# Altium footprint library MyPcbLib.PcbLib: 80 footprints (part 5 of 5)
Each footprint in its own frame and in the unit in brackets; x right, y up, seen from the top. Pads: shape width x height; smd on the part's side, far side on the other; paste and mask are expansions set on the pad; w line width, h text height; cw(c..) or ccw(c..) is an arc to the next point about the centre after c.
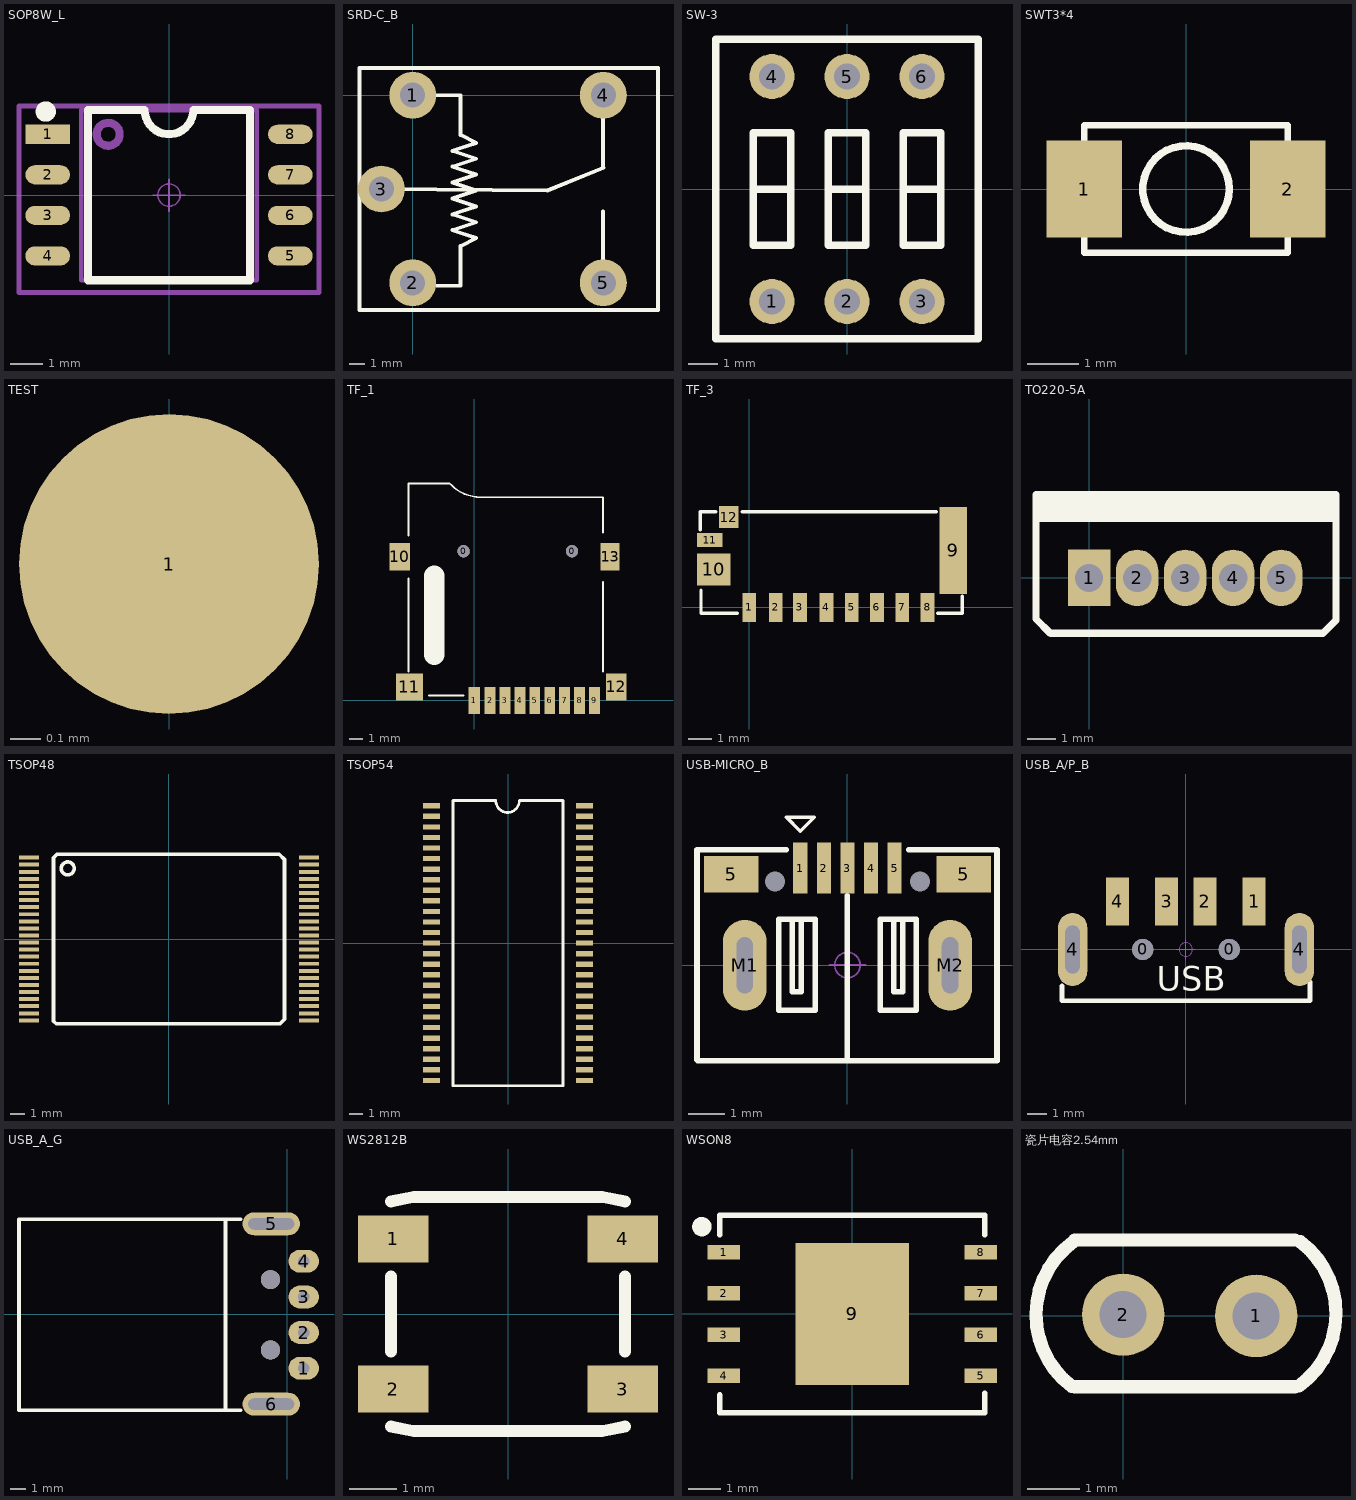
[diagram p4: the footprints below, top view; thin cyan lines are the x and y axes]

## SOP8W_L [mm]
pads (8):
  rect 1.4x0.6 smd: 1(-3.8,1.905)
  oval 1.4x0.6 smd: 2(-3.8,0.635) 3(-3.8,-0.635) 4(-3.8,-1.905) 5(3.8,-1.905) 6(3.8,-0.635) 7(3.8,0.635) 8(3.8,1.905)
Top Overlay:
  circle w0.381: c-3.861,2.616 r0.127
  lines w0.254: -2.54,-2.667 -2.54,2.667 -0.762,2.667 ccw(c0,2.667) 0.762,2.667 2.54,2.667 2.54,-2.667 -2.54,-2.667
Mechanical 13:
  circle w0.254: c-1.905,1.905 r0.359
  lines w0.15: -2.75,-2.667 2.75,-2.667 2.75,2.667 -2.75,2.667 -2.75,-2.667
Mechanical 15:
  circle w0.05: c0,0 r0.35
  lines w0.05: -0.5,0 0.5,0 ; 0,-0.5 0,0.5
  lines w0.15: -4.699,-3.048 -4.699,2.794 4.699,2.794 4.699,-3.048 -4.699,-3.048
3D body "SOP8W.STEP": height 1.9, standoff 0, extent -3.943,-2.64 3.943,2.64

## SRD-C_B [mm] "单刀双投"
pads (5):
  round 3 hole 1.6: 1(0,0) 2(0,-12) 3(-2,-6) 4(12.2,0) 5(12.2,-12)
Top Overlay:
  lines w0.254: -2,-6 8.636,-6.096 12.22,-4.64 ; 1.524,-12.192 3.048,-12.192 3.048,-10.668 3.048,-9.652 4.064,-9.144 2.54,-8.636 4.064,-8.128 2.54,-7.62 4.064,-7.112 2.54,-6.604 4.064,-6.096 2.54,-5.588 4.064,-5.08 2.54,-4.572 4.064,-4.064 2.54,-3.556 4.064,-3.048 3.048,-2.54 3.048,0 1.524,0 ; 12.192,-10.668 12.192,-8.636 ; 12.192,-9.144 12.192,-7.429 ; 12.192,-4.572 12.192,-1.524 ; -3.4,-13.75 15.7,-13.75 15.7,1.75 -3.4,1.75 -3.4,-13.75
3D body "小型继电器SRD-05VDC-SL-C.SLDPRT": height 15.3, standoff -5, extent -3.352,-13.846 15.748,1.654

## SW-3 [mil] "WWW.OURAVR.COM"
pads (6):
  round 60 hole 35: 1(-100,-150) 2(0,-150) 3(100,-150) 4(-100,150) 5(0,150) 6(100,150)
Top Overlay:
  lines w10: -75,0 -125,0 -125,75 ; 25,0 -25,0 -25,75 ; 125,0 75,0 75,75 ; -125,75 -125,-75 -75,-75 -75,75 -125,75 ; -25,75 -25,-75 25,-75 25,75 -25,75 ; 75,75 75,-75 125,-75 125,75 75,75 ; -175,-200 -175,200 175,200 175,-200 -175,-200
3D body "SWITCH DIP-3.STEP": height 275.59, standoff -145.67, extent -170,-194.88 169.37,194.88

## SWT3*4 [mm]
pads (2):
  rect 1.48x1.9 smd: 1(-2,0) 2(2,0)
Top Overlay:
  circle w0.15: c0,0 r0.85
  lines w0.127: -2,-1.25 2,-1.25 2,1.25 -2,1.25 -2,-1.25
3D body "SW-PB 3X4.STEP": height 2.1, standoff -0.05, extent -2.5,-1.527 2.5,1.473

## TEST [mm]
pads (1):
  round 1 smd: 1(0,1.4)

## TF_1 [mm]
pads (15):
  round 0.9 hole 0.9 unplated: 0(-0.8,11) 0(7.2,11)
  rect 0.85x2 smd: 1(0,0)
  rect 0.8x2 smd: 2(1.15,0) 3(2.25,0) 4(3.35,0) 5(4.45,0) 6(5.55,0) 7(6.65,0) 8(7.75,0) 9(8.85,0)
  rect 1.5x2 smd: 10(-5.5,10.6) 12(10.45,1)
  rect 2x2 smd: 11(-4.8,1)
  rect 1.4x2 smd: 13(10,10.6)
Top Overlay:
  lines w0.127: -4.865,12.143 -4.865,15 ; -4.865,14.683 -4.865,16 -1.816,16 -1.714,15.898 ccw(c0.454,18.066) 0.454,15 1.74,15 9.486,15 9.486,12.397 ; -4.862,2.138 -4.862,8.996 ; 9.489,2.138 9.489,8.742
  lines w0.15: -3.338,0.36 -0.798,0.36
  lines w1.5: -2.959,3.38 -2.959,9.222
3D body "User Library-112J-TXAR-R_C_1-1.STEP": height 1.85, standoff -0.6, extent -5.85,-0.001 10.25,15.001

## TF_3 [mm]
pads (12):
  rect 0.6x1.25 smd: 1(0,0) 2(1.15,0) 3(2.2,0) 4(3.35,0) 5(4.45,0) 6(5.55,0) 7(6.65,0) 8(7.75,0)
  rect 1.2x3.79 smd: 9(8.875,2.48)
  rect 1.45x1.4 smd: 10(-1.55,1.655)
  rect 1.1x0.6 smd: 11(-1.725,2.93)
  rect 0.85x0.95 smd: 12(-0.9,3.93)
Top Overlay:
  lines w0.15: -2.125,3.38 -2.125,4.155 -1.45,4.155 ; -2.1,0.755 -2.1,-0.245 -0.525,-0.245 ; -0.3,4.155 8.125,4.155 ; 8.2,-0.245 9.25,-0.245 9.25,0.48
3D body "473090285.stp": height 2.8, standoff -0.05, extent -2.125,-1.345 9.275,4.155

## TO220-5A [mm] "220，5脚晶体管"
pads (5):
  rect 1.5x2 hole 1: 1(0,0)
  oval 1.5x2 hole 1: 2(1.7,0) 3(3.4,0) 4(5.1,0) 5(6.8,0)
Top Overlay:
  rectangle: -1.88,2.189 8.74,2.946
  lines w0.254: -1.88,2.102 8.74,2.102 ; -1.88,-1.454 -1.372,-1.962 8.28,-1.962 8.74,-1.502 8.74,1.432 8.74,2.946 -1.88,2.946 -1.88,1.34 -1.88,-1.454
3D body "TO220-5A.STEP": height 17.5, standoff -4, extent -1.65,-1.8 8.45,2.7

## TSOP48 [mm]
pads (48):
  rect 1.4x0.28 smd: 1(-9.9,5.75) 2(-9.9,5.25) 3(-9.9,4.75) 4(-9.9,4.25) 5(-9.9,3.75) 6(-9.9,3.25) 7(-9.9,2.75) 8(-9.9,2.25) 9(-9.9,1.75) 10(-9.9,1.25) 11(-9.9,0.75) 12(-9.9,0.25) 13(-9.9,-0.25) 14(-9.9,-0.75) 15(-9.9,-1.25) 16(-9.9,-1.75) 17(-9.9,-2.25) 18(-9.9,-2.75) 19(-9.9,-3.25) 20(-9.9,-3.75) 21(-9.9,-4.25) 22(-9.9,-4.75) 23(-9.9,-5.25) 24(-9.9,-5.75) 25(9.9,-5.75) 26(9.9,-5.25) 27(9.9,-4.75) 28(9.9,-4.25) 29(9.9,-3.75) 30(9.9,-3.25) 31(9.9,-2.75) 32(9.9,-2.25) 33(9.9,-1.75) 34(9.9,-1.25) 35(9.9,-0.75) 36(9.9,-0.25) 37(9.9,0.25) 38(9.9,0.75) 39(9.9,1.25) 40(9.9,1.75) 41(9.9,2.25) 42(9.9,2.75) 43(9.9,3.25) 44(9.9,3.75) 45(9.9,4.25) 46(9.9,4.75) 47(9.9,5.25) 48(9.9,5.75)
Top Overlay:
  circle w0.254: c-7.156,4.988 r0.458
  lines w0.254: -0.729,6 0.795,6 ; -0.348,6 -7.915,6 -8.165,5.75 -8.165,-5.803 -7.968,-6 7.845,-6 8.165,-5.68 8.165,5.615 7.78,6 0.668,6
3D body "User Library-SST TSOP-48.STEP": height 1.2, standoff 0, extent -10.075,-6.096 10.125,6.104

## TSOP54 [mm]
pads (54):
  rect 1.3x0.4 smd: 1(-5.8,10.4) 2(-5.8,9.6) 3(-5.8,8.8) 4(-5.8,8) 5(-5.8,7.2) 6(-5.8,6.4) 7(-5.8,5.6) 8(-5.8,4.8) 9(-5.8,4) 10(-5.8,3.2) 11(-5.8,2.4) 12(-5.8,1.6) 13(-5.8,0.8) 14(-5.8,0) 15(-5.8,-0.8) 16(-5.8,-1.6) 17(-5.8,-2.4) 18(-5.8,-3.2) 19(-5.8,-4) 20(-5.8,-4.8) 21(-5.8,-5.6) 22(-5.8,-6.4) 23(-5.8,-7.2) 24(-5.8,-8) 25(-5.8,-8.8) 26(-5.8,-9.6) 27(-5.8,-10.4) 28(5.8,-10.4) 29(5.8,-9.6) 30(5.8,-8.8) 31(5.8,-8) 32(5.8,-7.2) 33(5.8,-6.4) 34(5.8,-5.6) 35(5.8,-4.8) 36(5.8,-4) 37(5.8,-3.2) 38(5.8,-2.4) 39(5.8,-1.6) 40(5.8,-0.8) 41(5.8,0) 42(5.8,0.8) 43(5.8,1.6) 44(5.8,2.4) 45(5.8,3.2) 46(5.8,4) 47(5.8,4.8) 48(5.8,5.6) 49(5.8,6.4) 50(5.8,7.2) 51(5.8,8) 52(5.8,8.8) 53(5.8,9.6) 54(5.8,10.4)
Top Overlay:
  lines w0.2: -0.939,10.8 -4.165,10.8 -4.165,-10.8 4.165,-10.8 4.165,10.8 0.877,10.8 ; -0.92,10.781 ccw(c-0.031,10.781) 0.858,10.781
3D body "SW3dPS-TSOP2-54.STEP": height 1.3, standoff -0.4, extent -5.886,-11.109 5.874,11.111

## USB-MICRO_B [mm] "micro型USB ，5.9*8.2*2.5mm"
pads (11):
  round 0 hole 0.55 unplated: 0(-2,2.294) 0(2,2.294)
  rect 0.394x1.4 smd: 1(-1.295,2.667) 2(-0.648,2.667) 3(0,2.667) 4(0.648,2.667) 5(1.295,2.667)
  rect 1.5x1 smd: 5(-3.2,2.5) 5(3.2,2.5)
  oval 1.2x2.5 hole 0.45 slot 1.55 at 90 deg: M1(-2.825,-0.006) M2(2.825,-0.006)
Top Overlay:
  lines w0.1: -1.676,4.064 -0.914,4.064 -1.295,3.683 -1.676,4.064
  lines w0.15: -4.14,3.175 -1.689,3.175 ; 0,-2.629 0,1.905 ; 1.689,3.175 4.115,3.175
  lines w0.152: -4.14,-2.603 -4.14,3.175 ; -4.115,-2.629 4.089,-2.629 ; -1.524,1.257 -1.524,-0.728 -1.321,-0.728 -1.27,-0.728 -1.27,1.257 ; 1.27,1.257 1.27,-0.728 1.524,-0.728 1.524,1.257 ; 4.115,-2.629 4.115,3.175 ; -1.885,-1.243 -1.885,1.257 -0.885,1.257 -0.885,-1.243 -1.885,-1.243 ; 0.896,-1.243 1.896,-1.243 1.896,1.257 0.896,1.257 0.896,-1.243
Mechanical 15:
  circle w0.05: c0,0 r0.35
  lines w0.05: -0.5,0 0.5,0 ; 0,-0.5 0,0.5
3D body "USB micro_B.STEP": height 2.8, standoff -1.35, extent -4.001,-2.716 4.001,2.884

## USB_A/P_B [mm] "A型USB 插头，20*13*4.5mm"
height 1.75
pads (8):
  round 1.1 hole 1.1: 0(-2.237,0) 0(2.263,0)
  rect 1.2x2.5 smd: 1(3.556,2.508) 2(1,2.508) 3(-1,2.508) 4(-3.556,2.508)
  oval 1.524x3.81 hole 0.762 slot 2.5 at 90 deg: 4(-5.887,0) 4(5.913,0)
Top Overlay:
  lines w0.254: -6.437,-1.9 -6.437,-2.667 6.463,-2.667 6.463,-1.7
  text "USB" at -1.511,-2.159 h1.27
Mechanical 15:
  circle w0.05: c0,0 r0.35
  lines w0.05: -0.5,0 0.5,0 ; 0,-0.5 0,0.5
3D body "USB A型 ?": height 3.25, standoff -2.52, extent -6.46,-17.9 6.487,2.7

## USB_A_G [mil]
height 68.9
pads (8):
  oval 80x60 hole 30: 1(43.5,-142) 2(43.5,-48.67) 3(43.5,44.67) 4(43.5,138)
  oval 150x60 hole 30 slot 120 at 0 deg: 5(-41.5,236) 6(-41.5,-236)
  round 50 hole 50: ""(-43.5,-94) ""(-43.5,90)
Top Overlay:
  lines w10: -121.5,-252 -161.5,-252 ; -121.5,248 -161.5,248 ; -161.5,-252 -161.5,248 ; -161.5,-252 -701.5,-252 -701.5,248 -161.5,248
3D body "USB-AM-S-F-B-TH.STEP": height 177.95, standoff -46.46, extent -739.61,-248.07 48.98,244.06

## WS2812B [mm]
height 2
pads (4):
  rect 1.5x1 smd: 1(-2.45,1.6) 2(-2.45,-1.6) 3(2.45,-1.6) 4(2.45,1.6)
Top Overlay:
  lines w0.254: -2.5,-2.4 -2,-2.5 2,-2.5 2.5,-2.4 ; -2.5,-0.8 -2.5,0.8 ; 2.5,-0.8 2.5,0.8 ; 2.5,2.4 2,2.5 -2,2.5 ; -2,2.5 -2.5,2.4 -2,2.5
3D body "User Library-ws2812B-1.STEP": height 1.54, standoff -0.03, extent -2.7,-2.5 2.7,2.5

## WSON8 [mm]
pads (9):
  rect 1x0.45 smd: 1(-3.975,1.905) 2(-3.975,0.635) 3(-3.975,-0.635) 4(-3.975,-1.905) 5(3.975,-1.905) 6(3.975,-0.635) 7(3.975,0.635) 8(3.975,1.905)
  rect 3.5x4.4 smd: 9(0,0)
Top Overlay:
  circle w0.3: c-4.65,2.7 r0.15
  lines w0.178: -4.1,-2.504 -4.1,-3.05 4.1,-3.05 4.1,-2.449 ; -4.1,2.449 -4.1,3.05 4.1,3.05 ; 4.1,2.449 4.1,3.048
Mechanical 15:
  lines w0.1: -0.5,0 0.5,0 ; 0,-0.5 0,0.5
3D body "User Library-WSON-8_6x8mm.STEP": height 0.81, standoff -0.07, extent -3.988,-3 4.012,3

## 瓷片电容2.54mm [mil]
pads (2):
  round 62 hole 35.43: 1(100,0) 2(0,1)
Top Overlay:
  lines w10: -38.7,-52.9 cw(c1.97,1) -37.75,55.6 ; -36.42,-53.15 128.94,-53.15 ; -36.42,57.09 128.94,57.09 ; 132.24,-52.64 ccw(c92.52,1.95) 133.18,55.85
3D body "CAP TR2.54.STEP": height 233.11, standoff -78.74, extent -64.95,-33.39 165,33.4